# Altium footprint library con-amp.PCBLIB: 295 footprints (part 12 of 19)
Each footprint in its own frame and in the unit in brackets; x right, y up, seen from the top. Pads: shape width x height; smd on the part's side, far side on the other; paste and mask are expansions set on the pad; w line width, h text height; cw(c..) or ccw(c..) is an arc to the next point about the centre after c.
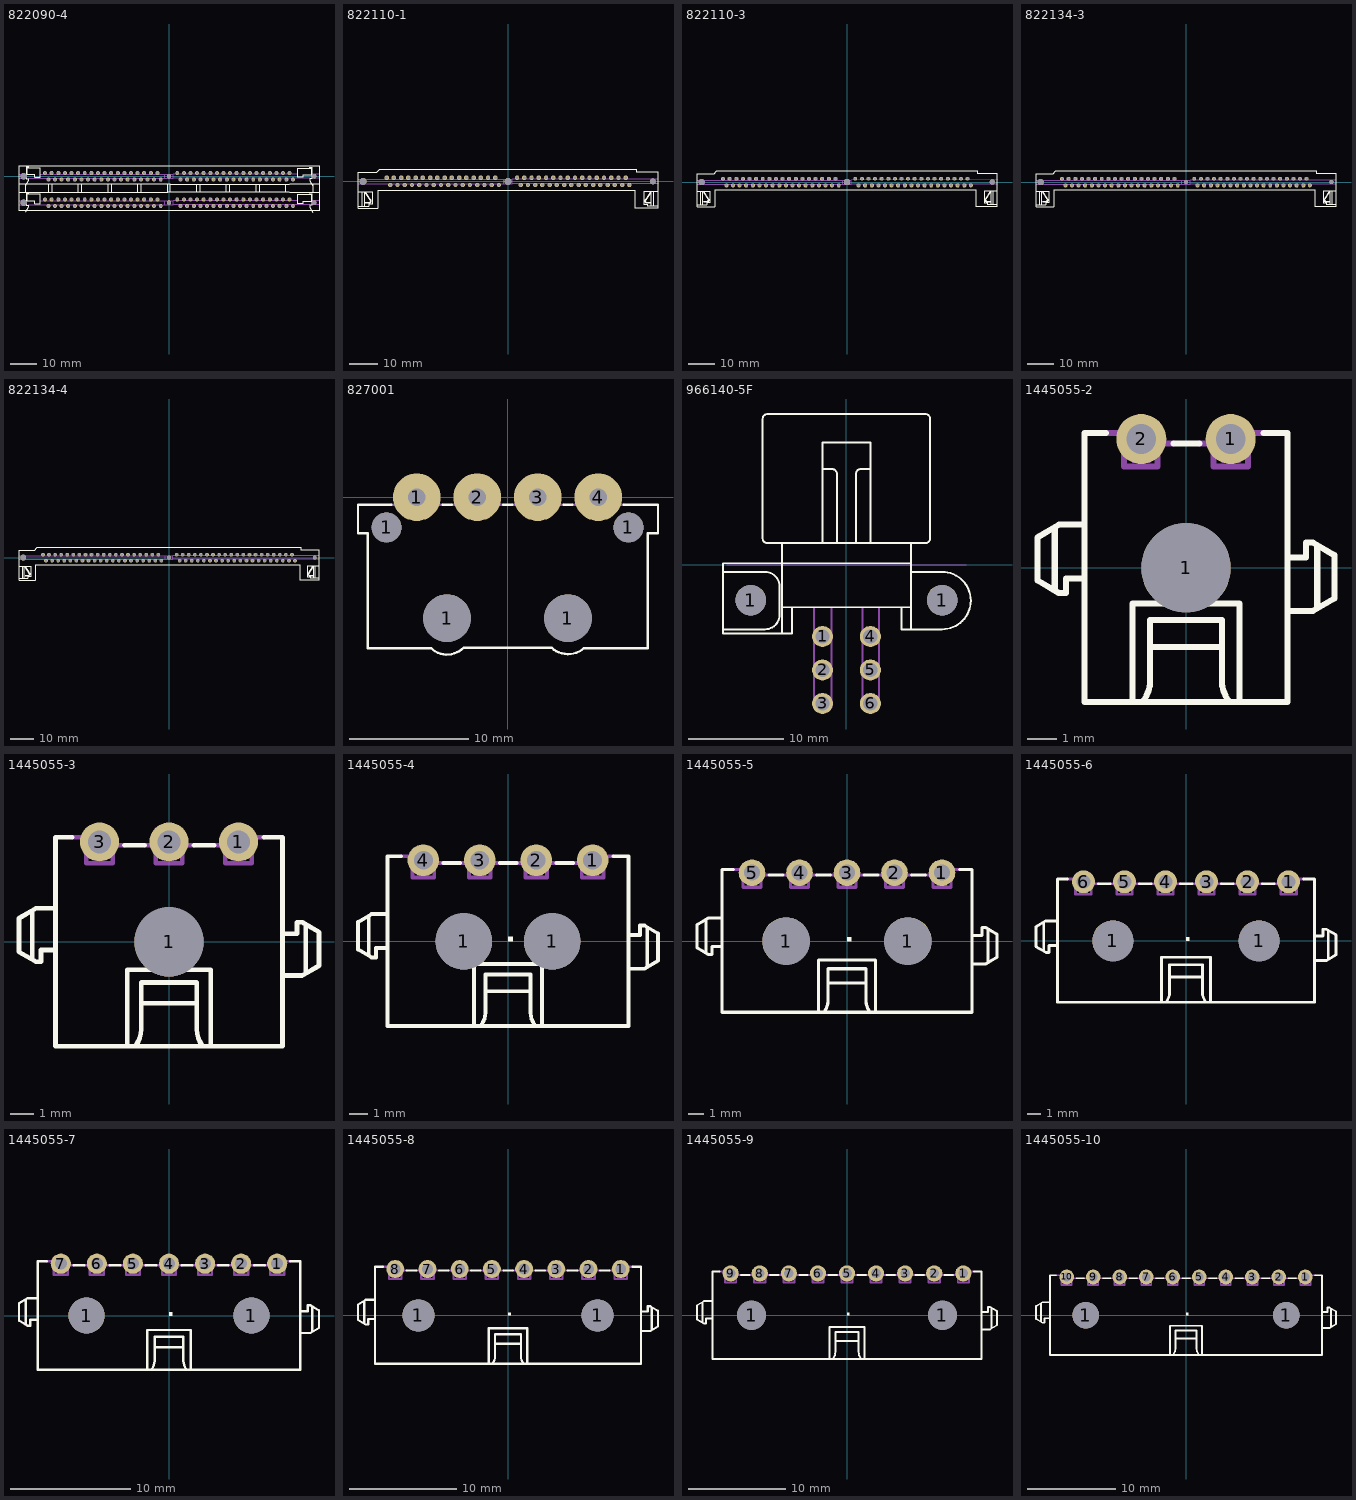
[diagram p11: the footprints below, top view; thin cyan lines are the x and y axes]

## 822090-4 [mil]
pads (150):
  round 96 hole 96: 1(-2200,-400) 1(-2200,0)
  round 64 hole 64: 1(0,-400) 1(0,0) 1(2200,-400) 1(2200,0)
  round 60 hole 40: 1-1(1875,-50) 2-1(1875,-450)
  oct 60x60 hole 40: 1-2(1825,50) 1-3(1775,-50) 1-4(1725,50) 1-5(1675,-50) 1-6(1625,50) 1-7(1575,-50) 1-8(1525,50) 1-9(1475,-50) 1-10(1425,50) 1-11(1375,-50) 1-12(1325,50) 1-13(1275,-50) 1-14(1225,50) 1-15(1175,-50) 1-16(1125,50) 1-17(1075,-50) 1-18(1025,50) 1-19(975,-50) 1-20(925,50) 1-21(875,-50) 1-22(825,50) 1-23(775,-50) 1-24(725,50) 1-25(675,-50) 1-26(625,50) 1-27(575,-50) 1-28(525,50) 1-29(475,-50) 1-30(425,50) 1-31(375,-50) 1-32(325,50) 1-33(275,-50) 1-34(225,50) 1-35(175,-50) 1-36(125,50) 1-37(-125,-50) 1-38(-175,50) 1-39(-225,-50) 1-40(-275,50) 1-41(-325,-50) 1-42(-375,50) 1-43(-425,-50) 1-44(-475,50) 1-45(-525,-50) 1-46(-575,50) 1-47(-625,-50) 1-48(-675,50) 1-49(-725,-50) 1-50(-775,50) 1-51(-825,-50) 1-52(-875,50) 1-53(-925,-50) 1-54(-975,50) 1-55(-1025,-50) 1-56(-1075,50) 1-57(-1125,-50) 1-58(-1175,50) 1-59(-1225,-50) 1-60(-1275,50) 1-61(-1325,-50) 1-62(-1375,50) 1-63(-1425,-50) 1-64(-1475,50) 1-65(-1525,-50) 1-66(-1575,50) 1-67(-1625,-50) 1-68(-1675,50) 1-69(-1725,-50) 1-70(-1775,50) 1-71(-1825,-50) 1-72(-1875,50) 2-2(1825,-350) 2-3(1775,-450) 2-4(1725,-350) 2-5(1675,-450) 2-6(1625,-350) 2-7(1575,-450) 2-8(1525,-350) 2-9(1475,-450) 2-10(1425,-350) 2-11(1375,-450) 2-12(1325,-350) 2-13(1275,-450) 2-14(1225,-350) 2-15(1175,-450) 2-16(1125,-350) 2-17(1075,-450) 2-18(1025,-350) 2-19(975,-450) 2-20(925,-350) 2-21(875,-450) 2-22(825,-350) 2-23(775,-450) 2-24(725,-350) 2-25(675,-450) 2-26(625,-350) 2-27(575,-450) 2-28(525,-350) 2-29(475,-450) 2-30(425,-350) 2-31(375,-450) 2-32(325,-350) 2-33(275,-450) 2-34(225,-350) 2-35(175,-450) 2-36(125,-350) 2-37(-125,-450) 2-38(-175,-350) 2-39(-225,-450) 2-40(-275,-350) 2-41(-325,-450) 2-42(-375,-350) 2-43(-425,-450) 2-44(-475,-350) 2-45(-525,-450) 2-46(-575,-350) 2-47(-625,-450) 2-48(-675,-350) 2-49(-725,-450) 2-50(-775,-350) 2-51(-825,-450) 2-52(-875,-350) 2-53(-925,-450) 2-54(-975,-350) 2-55(-1025,-450) 2-56(-1075,-350) 2-57(-1125,-450) 2-58(-1175,-350) 2-59(-1225,-450) 2-60(-1275,-350) 2-61(-1325,-450) 2-62(-1375,-350) 2-63(-1425,-450) 2-64(-1475,-350) 2-65(-1525,-450) 2-66(-1575,-350) 2-67(-1625,-450) 2-68(-1675,-350) 2-69(-1725,-450) 2-70(-1775,-350) 2-71(-1825,-450) 2-72(-1875,-350)
Top Overlay:
  lines w6: -2150,-375 -2150,-275 -1950,-275 -1950,-415 -2035,-415 -2035,-375 -2150,-375 ; -2150,25 -2150,125 -1950,125 -1950,-15 -2035,-15 -2035,25 -2150,25 ; 1950,-415 1950,-275 2150,-275 2150,-375 2035,-375 2035,-415 1950,-415 ; 1950,-15 1950,125 2150,125 2150,25 2035,25 2035,-15 1950,-15
  lines w10: 1820,-240 1770,-240 ; 1820,-120 1770,-120 ; 1830,-240 2180,-240 ; 1830,-120 2180,-120 ; -2270,-240 -2170,-240 ; -2270,-240 -2270,-520 2270,-520 2270,-240 ; -2270,-240 -2270,-120 ; -2270,-120 -2170,-120 ; -2270,-120 -2270,160 2270,160 2270,-120 ; -2170,-240 -1820,-240 ; -2170,-240 -2170,-120 ; -2170,-120 -1820,-120 ; -1820,-240 -1770,-240 ; -1820,-240 -1820,-120 ; -1820,-120 -1770,-120 ; -1770,-240 -1370,-240 ; -1770,-240 -1770,-120 ; -1770,-120 -1370,-120 ; -1370,-240 -1320,-240 ; -1370,-240 -1370,-120 ; -1370,-120 -1320,-120 ; -1320,-240 -920,-240 ; -1320,-240 -1320,-120 ; -1320,-120 -920,-120 ; -920,-240 -870,-240 ; -920,-240 -920,-120 ; -920,-120 -870,-120 ; -870,-240 -470,-240 ; -870,-240 -870,-120 ; -870,-120 -470,-120 ; -470,-240 -420,-240 ; -470,-240 -470,-120 ; -470,-120 -420,-120 ; -420,-240 -20,-240 ; -420,-240 -420,-120 ; -420,-120 -20,-120 ; -20,-240 -20,-120 ; -20,-240 20,-240 ; -20,-120 20,-120 ; 20,-240 420,-240 ; 20,-240 20,-120 ; 20,-120 420,-120 ; 420,-240 470,-240 ; 420,-240 420,-120 ; 420,-120 470,-120 ; 470,-240 870,-240 ; 470,-240 470,-120 ; 470,-120 870,-120 ; 870,-240 920,-240 ; 870,-240 870,-120 ; 870,-120 920,-120 ; 920,-240 1320,-240 ; 920,-240 920,-120 ; 920,-120 1320,-120 ; 1320,-240 1370,-240 ; 1320,-240 1320,-120 ; 1320,-120 1370,-120 ; 1370,-240 1770,-240 ; 1370,-240 1370,-120 ; 1370,-120 1770,-120 ; 1770,-240 1770,-120 ; 2180,-240 2270,-240 ; 2180,-240 2180,-120 ; 2180,-120 2270,-120 ; 2270,-240 2270,-120
  lines w16: -2175,-545 -2130,-465 -2130,-435 -2160,-435 -2160,-265 -2125,-265 ; -2175,-145 -2130,-65 -2130,-35 -2160,-35 -2160,135 -2125,135 ; 2125,-265 2160,-265 2160,-435 2130,-435 2130,-465 2175,-545 ; 2125,135 2160,135 2160,-35 2130,-35 2130,-65 2175,-145
Mechanical 16:
  lines w6: -2270,-430 -2170,-430 ; -2270,-370 -2170,-370 ; -2270,-30 -2165,-30 ; -2270,30 -2170,30 ; -2130,-430 -62,-430 ; -2130,-30 -62,-30 ; -1950,-370 -62,-370 ; -1945,30 -62,30 ; 1945,-370 62,-370 ; 1945,30 62,30 ; 2130,-430 62,-430 ; 2135,-30 62,-30 ; 2165,-430 2270,-430 ; 2165,-370 2270,-370 ; 2165,-30 2270,-30 ; 2165,30 2270,30 ; -62,-430 62,-430 ; -62,-430 -62,-370 ; -62,-370 62,-370 ; -62,-30 62,-30 ; -62,-30 -62,30 ; -62,30 62,30 ; 62,-430 62,-370 ; 62,-30 62,30

## 822110-1 [mil]
pads (67):
  round 95 hole 95: 1(-2000,0)
  round 96 hole 96: 1(0,0)
  round 60 hole 40: 1(1675,-50)
  round 80 hole 80: 1(2000,0)
  oct 60x60 hole 40: 2(1625,50) 3(1575,-50) 4(1525,50) 5(1475,-50) 6(1425,50) 7(1375,-50) 8(1325,50) 9(1275,-50) 10(1225,50) 11(1175,-50) 12(1125,50) 13(1075,-50) 14(1025,50) 15(975,-50) 16(925,50) 17(875,-50) 18(825,50) 19(775,-50) 20(725,50) 21(675,-50) 22(625,50) 23(575,-50) 24(525,50) 25(475,-50) 26(425,50) 27(375,-50) 28(325,50) 29(275,-50) 30(225,50) 31(175,-50) 32(125,50) 33(-125,-50) 34(-175,50) 35(-225,-50) 36(-275,50) 37(-325,-50) 38(-375,50) 39(-425,-50) 40(-475,50) 41(-525,-50) 42(-575,50) 43(-625,-50) 44(-675,50) 45(-725,-50) 46(-775,50) 47(-825,-50) 48(-875,50) 49(-925,-50) 50(-975,50) 51(-1025,-50) 52(-1075,50) 53(-1125,-50) 54(-1175,50) 55(-1225,-50) 56(-1275,50) 57(-1325,-50) 58(-1375,50) 59(-1425,-50) 60(-1475,50) 61(-1525,-50) 62(-1575,50) 63(-1625,-50) 64(-1675,50)
Top Overlay:
  lines w10: -2070,-340 -2070,-370 -1800,-370 -1800,-120 1750,-120 1750,-370 2070,-370 2070,-340 ; -2070,-340 -2070,-140 ; -2070,-340 -2010,-340 ; -2070,-140 -2070,125 -1810,125 -1775,160 1775,160 1775,125 2070,125 2070,-140 ; -2070,-140 -2010,-140 ; -2010,-340 -1980,-340 ; -2010,-340 -2010,-140 ; -2010,-140 -1980,-140 ; -1980,-340 -1925,-340 -1925,-315 -1875,-315 -1875,-140 -1980,-140 ; -1980,-340 -1980,-140 ; 1980,-340 2010,-340 ; 1980,-340 1925,-340 1925,-315 1875,-315 1875,-140 1980,-140 ; 1980,-340 1980,-140 ; 1980,-140 2010,-140 ; 2010,-340 2070,-340 ; 2010,-340 2010,-140 ; 2010,-140 2070,-140 ; 2070,-340 2070,-140
  lines w24: -1970,-295 -1920,-295 ccw(c-1917.5,-271.25) -1900,-255 -1970,-150 ; 1970,-295 1920,-295 cw(c1917.5,-271.25) 1900,-255 1970,-150
Mechanical 16:
  lines w6: -2065,-30 -62,-30 ; -2065,30 -62,30 ; 2065,30 62,30 ; 2070,-30 62,-30 ; -62,-30 62,-30 ; -62,-30 -62,30 ; -62,30 62,30 ; 62,-30 62,30

## 822110-3 [mil]
pads (75):
  round 95 hole 95: 1(-2200,0)
  round 96 hole 96: 1(0,0)
  round 60 hole 40: 1(1875,-50)
  round 80 hole 80: 1(2200,0)
  oct 60x60 hole 40: 2(1825,50) 3(1775,-50) 4(1725,50) 5(1675,-50) 6(1625,50) 7(1575,-50) 8(1525,50) 9(1475,-50) 10(1425,50) 11(1375,-50) 12(1325,50) 13(1275,-50) 14(1225,50) 15(1175,-50) 16(1125,50) 17(1075,-50) 18(1025,50) 19(975,-50) 20(925,50) 21(875,-50) 22(825,50) 23(775,-50) 24(725,50) 25(675,-50) 26(625,50) 27(575,-50) 28(525,50) 29(475,-50) 30(425,50) 31(375,-50) 32(325,50) 33(275,-50) 34(225,50) 35(175,-50) 36(125,50) 37(-125,-50) 38(-175,50) 39(-225,-50) 40(-275,50) 41(-325,-50) 42(-375,50) 43(-425,-50) 44(-475,50) 45(-525,-50) 46(-575,50) 47(-625,-50) 48(-675,50) 49(-725,-50) 50(-775,50) 51(-825,-50) 52(-875,50) 53(-925,-50) 54(-975,50) 55(-1025,-50) 56(-1075,50) 57(-1125,-50) 58(-1175,50) 59(-1225,-50) 60(-1275,50) 61(-1325,-50) 62(-1375,50) 63(-1425,-50) 64(-1475,50) 65(-1525,-50) 66(-1575,50) 67(-1625,-50) 68(-1675,50) 69(-1725,-50) 70(-1775,50) 71(-1825,-50) 72(-1875,50)
Top Overlay:
  lines w10: -2270,-340 -2270,-370 -2000,-370 -2000,-120 1950,-120 1950,-370 2270,-370 2270,-340 ; -2270,-340 -2270,-140 ; -2270,-340 -2210,-340 ; -2270,-140 -2270,125 -2010,125 -1975,160 1975,160 1975,125 2270,125 2270,-140 ; -2270,-140 -2210,-140 ; -2210,-340 -2180,-340 ; -2210,-340 -2210,-140 ; -2210,-140 -2180,-140 ; -2180,-340 -2125,-340 -2125,-315 -2075,-315 -2075,-140 -2180,-140 ; -2180,-340 -2180,-140 ; 2180,-340 2210,-340 ; 2180,-340 2125,-340 2125,-315 2075,-315 2075,-140 2180,-140 ; 2180,-340 2180,-140 ; 2180,-140 2210,-140 ; 2210,-340 2270,-340 ; 2210,-340 2210,-140 ; 2210,-140 2270,-140 ; 2270,-340 2270,-140
  lines w24: -2170,-295 -2120,-295 ccw(c-2117.5,-271.25) -2100,-255 -2170,-150 ; 2170,-295 2120,-295 cw(c2117.5,-271.25) 2100,-255 2170,-150
Mechanical 16:
  lines w6: -2265,-30 -62,-30 ; -2265,30 -62,30 ; 2270,-30 62,-30 ; 2270,35 62,30 ; -62,-30 62,-30 ; -62,-30 -62,30 ; -62,30 62,30 ; 62,-30 62,30

## 822134-3 [mil]
pads (75):
  round 95 hole 95: 1(-2200,0)
  round 64 hole 64: 1(0,0) 1(2200,0)
  round 60 hole 40: 1(1875,-50)
  oct 60x60 hole 40: 2(1825,50) 3(1775,-50) 4(1725,50) 5(1675,-50) 6(1625,50) 7(1575,-50) 8(1525,50) 9(1475,-50) 10(1425,50) 11(1375,-50) 12(1325,50) 13(1275,-50) 14(1225,50) 15(1175,-50) 16(1125,50) 17(1075,-50) 18(1025,50) 19(975,-50) 20(925,50) 21(875,-50) 22(825,50) 23(775,-50) 24(725,50) 25(675,-50) 26(625,50) 27(575,-50) 28(525,50) 29(475,-50) 30(425,50) 31(375,-50) 32(325,50) 33(275,-50) 34(225,50) 35(175,-50) 36(125,50) 37(-125,-50) 38(-175,50) 39(-225,-50) 40(-275,50) 41(-325,-50) 42(-375,50) 43(-425,-50) 44(-475,50) 45(-525,-50) 46(-575,50) 47(-625,-50) 48(-675,50) 49(-725,-50) 50(-775,50) 51(-825,-50) 52(-875,50) 53(-925,-50) 54(-975,50) 55(-1025,-50) 56(-1075,50) 57(-1125,-50) 58(-1175,50) 59(-1225,-50) 60(-1275,50) 61(-1325,-50) 62(-1375,50) 63(-1425,-50) 64(-1475,50) 65(-1525,-50) 66(-1575,50) 67(-1625,-50) 68(-1675,50) 69(-1725,-50) 70(-1775,50) 71(-1825,-50) 72(-1875,50)
Top Overlay:
  lines w10: -2270,-340 -2270,-370 -2000,-370 -2000,-120 1950,-120 1950,-370 2270,-370 2270,-340 ; -2270,-340 -2270,-140 ; -2270,-340 -2210,-340 ; -2270,-140 -2270,125 -2010,125 -1975,160 1975,160 1975,125 2270,125 2270,-140 ; -2270,-140 -2210,-140 ; -2210,-340 -2180,-340 ; -2210,-340 -2210,-140 ; -2210,-140 -2180,-140 ; -2180,-340 -2125,-340 -2125,-315 -2075,-315 -2075,-140 -2180,-140 ; -2180,-340 -2180,-140 ; 2180,-340 2210,-340 ; 2180,-340 2125,-340 2125,-315 2075,-315 2075,-140 2180,-140 ; 2180,-340 2180,-140 ; 2180,-140 2210,-140 ; 2210,-340 2270,-340 ; 2210,-340 2210,-140 ; 2210,-140 2270,-140 ; 2270,-340 2270,-140
  lines w24: -2170,-295 -2120,-295 ccw(c-2117.5,-271.25) -2100,-255 -2170,-150 ; 2170,-295 2120,-295 cw(c2117.5,-271.25) 2100,-255 2170,-150
Mechanical 16:
  lines w6: -2265,-30 -62,-30 ; -2265,30 -62,30 ; 2265,-30 62,-30 ; 2265,30 62,30 ; -62,-30 62,-30 ; -62,-30 -62,30 ; -62,30 62,30 ; 62,-30 62,30

## 822134-4 [mil]
pads (83):
  round 95 hole 95: 1(-2400,0)
  round 64 hole 64: 1(0,0) 1(2400,0)
  round 60 hole 40: 1(2075,-50)
  oct 60x60 hole 40: 2(2025,50) 3(1975,-50) 4(1925,50) 5(1875,-50) 6(1825,50) 7(1775,-50) 8(1725,50) 9(1675,-50) 10(1625,50) 11(1575,-50) 12(1525,50) 13(1475,-50) 14(1425,50) 15(1375,-50) 16(1325,50) 17(1275,-50) 18(1225,50) 19(1175,-50) 20(1125,50) 21(1075,-50) 22(1025,50) 23(975,-50) 24(925,50) 25(875,-50) 26(825,50) 27(775,-50) 28(725,50) 29(675,-50) 30(625,50) 31(575,-50) 32(525,50) 33(475,-50) 34(425,50) 35(375,-50) 36(325,50) 37(275,-50) 38(225,50) 39(175,-50) 40(125,50) 41(-125,-50) 42(-175,50) 43(-225,-50) 44(-275,50) 45(-325,-50) 46(-375,50) 47(-425,-50) 48(-475,50) 49(-525,-50) 50(-575,50) 51(-625,-50) 52(-675,50) 53(-725,-50) 54(-775,50) 55(-825,-50) 56(-875,50) 57(-925,-50) 58(-975,50) 59(-1025,-50) 60(-1075,50) 61(-1125,-50) 62(-1175,50) 63(-1225,-50) 64(-1275,50) 65(-1325,-50) 66(-1375,50) 67(-1425,-50) 68(-1475,50) 69(-1525,-50) 70(-1575,50) 71(-1625,-50) 72(-1675,50) 73(-1725,-50) 74(-1775,50) 75(-1825,-50) 76(-1875,50) 77(-1925,-50) 78(-1975,50) 79(-2025,-50) 80(-2075,50)
Top Overlay:
  lines w10: -2470,-340 -2470,-370 -2200,-370 -2200,-120 2150,-120 2150,-370 2470,-370 2470,-340 ; -2470,-340 -2470,-140 ; -2470,-340 -2410,-340 ; -2470,-140 -2470,125 -2210,125 -2175,160 2175,160 2175,125 2470,125 2470,-140 ; -2470,-140 -2410,-140 ; -2410,-340 -2380,-340 ; -2410,-340 -2410,-140 ; -2410,-140 -2380,-140 ; -2380,-340 -2325,-340 -2325,-315 -2275,-315 -2275,-140 -2380,-140 ; -2380,-340 -2380,-140 ; 2380,-340 2410,-340 ; 2380,-340 2325,-340 2325,-315 2275,-315 2275,-140 2380,-140 ; 2380,-340 2380,-140 ; 2380,-140 2410,-140 ; 2410,-340 2470,-340 ; 2410,-340 2410,-140 ; 2410,-140 2470,-140 ; 2470,-340 2470,-140
  lines w24: -2370,-295 -2320,-295 ccw(c-2317.5,-271.25) -2300,-255 -2370,-150 ; 2370,-295 2320,-295 cw(c2317.5,-271.25) 2300,-255 2370,-150
Mechanical 16:
  lines w6: -2465,-30 -62,-30 ; -2465,30 -62,30 ; 2465,-30 62,-30 ; 2465,30 62,30 ; -62,-30 62,-30 ; -62,-30 -62,30 ; -62,30 62,30 ; 62,-30 62,30

## 827001 [mm]
pads (8):
  round 2.5 hole 2.5: 1(-10.16,-2.54) 1(10.16,-2.54)
  round 4 hole 1.5: 1(-7.62,0) 2(-2.54,0) 3(2.54,0) 4(7.62,0)
  round 4 hole 4: 1(-5.08,-10.16) 1(5.08,-10.16)
Top Overlay:
  circle w0.203: c3.688,-12.638 r0
  lines w0.203: -9.779,-0.635 -12.555,-0.635 -12.555,-3.025 -11.726,-3.025 -11.726,-12.679 -6.423,-12.679 ccw(c-5.077,-11.252) -3.688,-12.638 3.688,-12.638 ; -5.461,-0.635 -4.699,-0.635 ; -0.381,-0.635 0.381,-0.635 ; 4.699,-0.635 5.461,-0.635 ; 9.779,-0.635 12.638,-0.635 12.638,-3.025 11.768,-3.025 11.768,-12.679 6.423,-12.679 cw(c5.079,-11.113) 3.688,-12.638 ; 3.688,-12.638 3.688,-12.638
Mechanical 16:
  lines w0.203: -9.779,-0.635 -9.398,-0.635 -9.398,0 -8.636,0.508 -8.255,0.508 -8.128,0.127 -7.112,0.127 -6.985,0.508 -6.604,0.508 -5.842,0.127 -5.842,-0.635 -5.461,-0.635 ; -4.699,-0.635 -4.318,-0.635 -4.318,0 -3.556,0.508 -3.175,0.508 -3.048,0.127 -2.032,0.127 -1.905,0.508 -1.524,0.508 -0.762,0.127 -0.762,-0.635 -0.381,-0.635 ; 0.381,-0.635 0.762,-0.635 0.762,0 1.524,0.508 1.905,0.508 2.032,0.127 3.048,0.127 3.175,0.508 3.556,0.508 4.318,0.127 4.318,-0.635 4.699,-0.635 ; 5.461,-0.635 5.842,-0.635 5.842,0 6.604,0.508 6.985,0.508 7.112,0.127 8.128,0.127 8.255,0.508 8.636,0.508 9.398,0.127 9.398,-0.635 9.779,-0.635

## 966140-5F [mm]
pads (8):
  round 3.2 hole 3.2: 1(-10,-3.7) 1(10,-3.7)
  round 2.2 hole 1.5: 1(-2.5,-7.5) 2(-2.5,-11) 3(-2.5,-14.5) 4(2.5,-7.5) 5(2.5,-11) 6(2.5,-14.5)
Top Overlay:
  lines w0.203: -12.75,-6.75 -8.5,-6.75 ccw(c-8.5,-5.25) -7,-5.25 -7,-2.25 ccw(c-8.5,-2.25) -8.5,-0.75 -12.75,-0.75 ; -6.727,-7.15 -6.727,2.222 ; -6.612,-4.448 6.612,-4.448 ; -5.692,-4.563 -5.692,-7.208 -12.88,-7.208 -12.88,0.152 -12.822,0.152 6.612,0.152 ; 5.75,-4.5 5.75,-6.75 6.75,-6.75 ; -2.5,2.25 -1,2.25 ; -2.5,2.25 -8.25,2.25 cw(c-8.25,2.75) -8.75,2.75 -8.75,15.25 cw(c-8.25,15.25) -8.25,15.75 8.25,15.75 cw(c8.25,15.25) 8.75,15.25 8.75,2.75 cw(c8.25,2.75) 8.25,2.25 6.75,2.25 ; -2.5,2.25 -2.5,10 ; -2.5,10 -2.5,12.75 2.5,12.75 2.5,10 ; -2.5,10 -1.5,10 cw(c-1.5,9.5) -1,9.5 -1,2.25 ; -1,2.25 1,2.25 ; 1,2.25 2.5,2.25 ; 1,2.25 1,9.5 cw(c1.5,9.5) 1.5,10 2.5,10 ; 2.5,2.25 6.75,2.25 ; 2.5,2.25 2.5,10 ; 6.75,-6.75 6.75,-0.75 ; 6.75,-6.75 10,-6.75 ccw(c10,-3.75) 13,-3.75 ccw(c10,-3.75) 10,-0.75 6.75,-0.75 ; 6.75,-0.75 6.75,2.25
Mechanical 1:
  lines w0: -12.5,0 12.5,0
Mechanical 16:
  lines w0.203: -3.392,-4.505 -3.392,-14.913 -1.552,-14.913 -1.552,-4.563 ; 1.668,-4.563 1.668,-14.913 3.392,-14.913 3.392,-4.563

## 1445055-2 [mm]
pads (3):
  round 3 hole 3: 1(0,0)
  round 1.676 hole 1: 1(1.5,4.32) 2(-1.5,4.32)
Top Overlay:
  region: 0,0 0.254,0 0.254,0.254 0,0.254
  region: 0,0 0.254,0 0.254,0.254 0,0.254
  region: 0,0 0.254,0 0.254,0.254 0,0.254
  region: 0,0 0.254,0 0.254,0.254 0,0.254
  lines w0.203: -4.4,-0.7 -4.4,1.3 ; -3.5,-0.35 -4.025,-0.35 -4.025,-0.85 -4.25,-0.85 -4.975,-0.425 -4.975,1.025 -4.25,1.45 -3.5,1.45 ; -2.675,4.525 -3.4,4.525 -3.4,-4.5 3.4,-4.5 3.4,4.525 2.6,4.525 ; -1.8,-4.4 -1.8,-1.2 1.8,-1.2 1.8,-4.4 ; -1.425,-4.45 ccw(c-2.325,-3.775) -1.2,-3.775 -1.2,-2.65 ; -0.425,4.175 0.45,4.175 ; 1.425,-4.45 cw(c2.325,-3.775) 1.2,-3.775 1.2,-2.65 ; 3.5,-1.45 4.25,-1.45 4.975,-1.025 4.975,0.425 4.25,0.85 4.025,0.85 4.025,0.35 3.5,0.35 ; 4.4,-1.3 4.4,0.7 ; -1.2,-2.65 1.2,-2.65 ; -1.2,-2.65 -1.2,-1.75 1.2,-1.75 1.2,-2.65
Mechanical 16:
  rectangle: -1.813,3.513 -1.187,5
  rectangle: 1.187,3.513 1.825,5
  lines w0.203: -2.675,4.525 -2.075,4.525 -2.075,3.4 -0.95,3.4 -0.95,4.175 -0.425,4.175 ; 0.45,4.175 0.925,4.175 0.925,3.4 2.075,3.4 2.075,4.525 2.6,4.525

## 1445055-3 [mm]
pads (4):
  round 3 hole 3: 1(0,0)
  round 1.676 hole 1: 1(3,4.32) 2(0,4.32) 3(-3,4.32)
Top Overlay:
  region: 0,0 0.254,0 0.254,0.254 0,0.254
  region: 0,0 0.254,0 0.254,0.254 0,0.254
  region: 0,0 0.254,0 0.254,0.254 0,0.254
  region: 0,0 0.254,0 0.254,0.254 0,0.254
  lines w0.203: -5.9,-0.7 -5.9,1.3 ; -5,-0.35 -5.525,-0.35 -5.525,-0.85 -5.75,-0.85 -6.475,-0.425 -6.475,1.025 -5.75,1.45 -5,1.45 ; -4.175,4.525 -4.9,4.525 -4.9,-4.5 4.9,-4.5 4.9,4.525 4.1,4.525 ; -1.925,4.175 -1.05,4.175 ; -1.8,-4.4 -1.8,-1.2 1.8,-1.2 1.8,-4.4 ; -1.425,-4.45 ccw(c-2.325,-3.775) -1.2,-3.775 -1.2,-2.65 ; 1.075,4.175 1.95,4.175 ; 1.425,-4.45 cw(c2.325,-3.775) 1.2,-3.775 1.2,-2.65 ; 5,-1.45 5.75,-1.45 6.475,-1.025 6.475,0.425 5.75,0.85 5.525,0.85 5.525,0.35 5,0.35 ; 5.9,-1.3 5.9,0.7 ; -1.2,-2.65 1.2,-2.65 ; -1.2,-2.65 -1.2,-1.75 1.2,-1.75 1.2,-2.65
Mechanical 16:
  rectangle: 2.688,3.513 3.325,5
  rectangle: -0.312,3.513 0.325,5
  rectangle: -3.312,3.513 -2.688,5
  lines w0.203: -4.175,4.525 -3.575,4.525 -3.575,3.4 -2.425,3.4 -2.425,4.175 -1.925,4.175 ; -1.05,4.175 -0.575,4.175 -0.575,3.4 0.575,3.4 0.575,4.175 1.075,4.175 ; 1.95,4.175 2.425,4.175 2.425,3.4 3.575,3.4 3.575,4.525 4.1,4.525

## 1445055-4 [mm]
pads (6):
  round 3 hole 3: 1(-2.35,0) 1(2.35,0)
  round 1.676 hole 1: 1(4.5,4.32) 2(1.5,4.32) 3(-1.5,4.32) 4(-4.5,4.32)
Top Overlay:
  region: 0,0 0.254,0 0.254,0.254 0,0.254
  region: 0,0 0.254,0 0.254,0.254 0,0.254
  region: 0,0 0.254,0 0.254,0.254 0,0.254
  region: 0,0 0.254,0 0.254,0.254 0,0.254
  lines w0.203: -7.4,-0.7 -7.4,1.3 ; -6.5,-0.35 -7.025,-0.35 -7.025,-0.85 -7.25,-0.85 -7.975,-0.425 -7.975,1.025 -7.25,1.45 -6.5,1.45 ; -5.675,4.525 -6.4,4.525 -6.4,-4.5 6.4,-4.5 6.4,4.525 5.6,4.525 ; -3.425,4.175 -2.55,4.175 ; -1.8,-4.4 -1.8,-1.2 1.8,-1.2 1.8,-4.4 ; -1.425,-4.45 ccw(c-2.325,-3.775) -1.2,-3.775 -1.2,-2.65 ; -0.425,4.175 0.45,4.175 ; 1.425,-4.45 cw(c2.325,-3.775) 1.2,-3.775 1.2,-2.65 ; 2.575,4.175 3.45,4.175 ; 6.5,-1.45 7.25,-1.45 7.975,-1.025 7.975,0.425 7.25,0.85 7.025,0.85 7.025,0.35 6.5,0.35 ; 7.4,-1.3 7.4,0.7 ; -1.2,-2.65 1.2,-2.65 ; -1.2,-2.65 -1.2,-1.75 1.2,-1.75 1.2,-2.65
Mechanical 16:
  rectangle: 4.187,3.513 4.825,5
  rectangle: -1.813,3.513 -1.175,5
  rectangle: 1.187,3.513 1.825,5
  rectangle: -4.813,3.513 -4.187,5
  lines w0.203: -5.675,4.525 -5.075,4.525 -5.075,3.4 -3.925,3.4 -3.925,4.175 -3.425,4.175 ; -2.55,4.175 -2.075,4.175 -2.075,3.4 -0.925,3.4 -0.925,4.175 -0.425,4.175 ; 0.45,4.175 0.925,4.175 0.925,3.4 2.075,3.4 2.075,4.175 2.575,4.175 ; 3.45,4.175 3.925,4.175 3.925,3.4 5.075,3.4 5.075,4.525 5.6,4.525

## 1445055-5 [mm]
pads (7):
  round 3 hole 3: 1(-3.85,0) 1(3.85,0)
  round 1.676 hole 1: 1(6,4.32) 2(3,4.32) 3(0,4.32) 4(-3,4.32) 5(-6,4.32)
Top Overlay:
  region: 0,0 0.254,0 0.254,0.254 0,0.254
  region: 0,0 0.254,0 0.254,0.254 0,0.254
  region: 0,0 0.254,0 0.254,0.254 0,0.254
  region: 0,0 0.254,0 0.254,0.254 0,0.254
  lines w0.203: -8.9,-0.7 -8.9,1.3 ; -8,-0.35 -8.525,-0.35 -8.525,-0.85 -8.75,-0.85 -9.475,-0.425 -9.475,1.025 -8.75,1.45 -8,1.45 ; -7.175,4.525 -7.9,4.525 -7.9,-4.5 7.9,-4.5 7.9,4.525 7.1,4.525 ; -4.925,4.175 -4.05,4.175 ; -1.925,4.175 -1.05,4.175 ; -1.8,-4.4 -1.8,-1.2 1.8,-1.2 1.8,-4.4 ; -1.425,-4.45 ccw(c-2.325,-3.775) -1.2,-3.775 -1.2,-2.65 ; 1.075,4.175 1.95,4.175 ; 1.425,-4.45 cw(c2.325,-3.775) 1.2,-3.775 1.2,-2.65 ; 4.075,4.175 4.95,4.175 ; 8,-1.45 8.75,-1.45 9.475,-1.025 9.475,0.425 8.75,0.85 8.525,0.85 8.525,0.35 8,0.35 ; 8.9,-1.3 8.9,0.7 ; -1.2,-2.65 1.2,-2.65 ; -1.2,-2.65 -1.2,-1.75 1.2,-1.75 1.2,-2.65
Mechanical 16:
  rectangle: 5.688,3.513 6.325,5
  rectangle: -0.312,3.513 0.325,5
  rectangle: 2.688,3.513 3.325,5
  rectangle: -3.312,3.513 -2.675,5
  rectangle: -6.312,3.513 -5.688,5
  lines w0.203: -7.175,4.525 -6.575,4.525 -6.575,3.4 -5.425,3.4 -5.425,4.175 -4.925,4.175 ; -4.05,4.175 -3.575,4.175 -3.575,3.4 -2.425,3.4 -2.425,4.175 -1.925,4.175 ; -1.05,4.175 -0.575,4.175 -0.575,3.4 0.575,3.4 0.575,4.175 1.075,4.175 ; 1.95,4.175 2.425,4.175 2.425,3.4 3.575,3.4 3.575,4.175 4.075,4.175 ; 4.95,4.175 5.425,4.175 5.425,3.4 6.575,3.4 6.575,4.525 7.1,4.525

## 1445055-6 [mm]
pads (8):
  round 3 hole 3: 1(-5.35,0) 1(5.35,0)
  round 1.676 hole 1: 1(7.5,4.32) 2(4.5,4.32) 3(1.5,4.32) 4(-1.5,4.32) 5(-4.5,4.32) 6(-7.5,4.32)
Top Overlay:
  region: 0,0 0.254,0 0.254,0.254 0,0.254
  region: 0,0 0.254,0 0.254,0.254 0,0.254
  region: 0,0 0.254,0 0.254,0.254 0,0.254
  region: 0,0 0.254,0 0.254,0.254 0,0.254
  lines w0.203: -10.4,-0.7 -10.4,1.3 ; -9.5,-0.35 -10.025,-0.35 -10.025,-0.85 -10.25,-0.85 -10.975,-0.425 -10.975,1.025 -10.25,1.45 -9.5,1.45 ; -8.675,4.525 -9.4,4.525 -9.4,-4.5 9.4,-4.5 9.4,4.525 8.6,4.525 ; -6.425,4.175 -5.55,4.175 ; -3.425,4.175 -2.55,4.175 ; -1.8,-4.4 -1.8,-1.2 1.8,-1.2 1.8,-4.4 ; -1.425,-4.45 ccw(c-2.325,-3.775) -1.2,-3.775 -1.2,-2.65 ; -0.425,4.175 0.45,4.175 ; 1.425,-4.45 cw(c2.325,-3.775) 1.2,-3.775 1.2,-2.65 ; 2.575,4.175 3.45,4.175 ; 5.575,4.175 6.45,4.175 ; 9.5,-1.45 10.25,-1.45 10.975,-1.025 10.975,0.425 10.25,0.85 10.025,0.85 10.025,0.35 9.5,0.35 ; 10.4,-1.3 10.4,0.7 ; -1.2,-2.65 1.2,-2.65 ; -1.2,-2.65 -1.2,-1.75 1.2,-1.75 1.2,-2.65
Mechanical 16:
  rectangle: 7.187,3.513 7.825,5
  rectangle: 1.187,3.513 1.825,5
  rectangle: 4.187,3.513 4.825,5
  rectangle: -1.813,3.513 -1.175,5
  rectangle: -4.813,3.513 -4.175,5
  rectangle: -7.813,3.513 -7.187,5
  lines w0.203: -8.675,4.525 -8.075,4.525 -8.075,3.4 -6.925,3.4 -6.925,4.175 -6.425,4.175 ; -5.55,4.175 -5.075,4.175 -5.075,3.4 -3.925,3.4 -3.925,4.175 -3.425,4.175 ; -2.55,4.175 -2.075,4.175 -2.075,3.4 -0.925,3.4 -0.925,4.175 -0.425,4.175 ; 0.45,4.175 0.925,4.175 0.925,3.4 2.075,3.4 2.075,4.175 2.575,4.175 ; 3.45,4.175 3.925,4.175 3.925,3.4 5.075,3.4 5.075,4.175 5.575,4.175 ; 6.45,4.175 6.925,4.175 6.925,3.4 8.075,3.4 8.075,4.525 8.6,4.525

## 1445055-7 [mm]
pads (9):
  round 3 hole 3: 1(-6.85,0) 1(6.85,0)
  round 1.676 hole 1: 1(9,4.32) 2(6,4.32) 3(3,4.32) 4(0,4.32) 5(-3,4.32) 6(-6,4.32) 7(-9,4.32)
Top Overlay:
  region: 0,0 0.254,0 0.254,0.254 0,0.254
  region: 0,0 0.254,0 0.254,0.254 0,0.254
  region: 0,0 0.254,0 0.254,0.254 0,0.254
  region: 0,0 0.254,0 0.254,0.254 0,0.254
  lines w0.203: -11.9,-0.7 -11.9,1.3 ; -11,-0.35 -11.525,-0.35 -11.525,-0.85 -11.75,-0.85 -12.475,-0.425 -12.475,1.025 -11.75,1.45 -11,1.45 ; -10.175,4.525 -10.9,4.525 -10.9,-4.5 10.9,-4.5 10.9,4.525 10.1,4.525 ; -7.925,4.175 -7.05,4.175 ; -4.925,4.175 -4.05,4.175 ; -1.925,4.175 -1.05,4.175 ; -1.8,-4.4 -1.8,-1.2 1.8,-1.2 1.8,-4.4 ; -1.425,-4.45 ccw(c-2.325,-3.775) -1.2,-3.775 -1.2,-2.65 ; 1.075,4.175 1.95,4.175 ; 1.425,-4.45 cw(c2.325,-3.775) 1.2,-3.775 1.2,-2.65 ; 4.075,4.175 4.95,4.175 ; 7.075,4.175 7.95,4.175 ; 11,-1.45 11.75,-1.45 12.475,-1.025 12.475,0.425 11.75,0.85 11.525,0.85 11.525,0.35 11,0.35 ; 11.9,-1.3 11.9,0.7 ; -1.2,-2.65 1.2,-2.65 ; -1.2,-2.65 -1.2,-1.75 1.2,-1.75 1.2,-2.65
Mechanical 16:
  rectangle: 8.688,3.513 9.325,5
  rectangle: 2.688,3.513 3.325,5
  rectangle: 5.688,3.513 6.325,5
  rectangle: -0.312,3.513 0.325,5
  rectangle: -3.312,3.513 -2.675,5
  rectangle: -6.312,3.513 -5.675,5
  rectangle: -9.312,3.513 -8.688,5
  lines w0.203: -10.175,4.525 -9.575,4.525 -9.575,3.4 -8.425,3.4 -8.425,4.175 -7.925,4.175 ; -7.05,4.175 -6.575,4.175 -6.575,3.4 -5.425,3.4 -5.425,4.175 -4.925,4.175 ; -4.05,4.175 -3.575,4.175 -3.575,3.4 -2.425,3.4 -2.425,4.175 -1.925,4.175 ; -1.05,4.175 -0.575,4.175 -0.575,3.4 0.575,3.4 0.575,4.175 1.075,4.175 ; 1.95,4.175 2.425,4.175 2.425,3.4 3.575,3.4 3.575,4.175 4.075,4.175 ; 4.95,4.175 5.425,4.175 5.425,3.4 6.575,3.4 6.575,4.175 7.075,4.175 ; 7.95,4.175 8.425,4.175 8.425,3.4 9.575,3.4 9.575,4.525 10.1,4.525

## 1445055-8 [mil]
pads (10):
  round 118.11 hole 118.11: 1(-328.74,0) 1(328.74,0)
  round 66 hole 39.37: 1(413.39,170.08) 2(295.28,170.08) 3(177.17,170.08) 4(59.06,170.08) 5(-59.06,170.08) 6(-177.17,170.08) 7(-295.28,170.08) 8(-413.39,170.08)
Top Overlay:
  region: 0,0 10,0 10,10 0,10
  region: 0,0 10,0 10,10 0,10
  region: 0,0 10,0 10,10 0,10
  region: 0,0 10,0 10,10 0,10
  lines w8: -527.56,-27.56 -527.56,51.18 ; -492.13,-13.78 -512.8,-13.78 -512.8,-33.46 -521.65,-33.46 -550.2,-16.73 -550.2,40.35 -521.65,57.09 -492.13,57.09 ; -459.65,178.15 -488.19,178.15 -488.19,-177.17 488.19,-177.17 488.19,178.15 456.69,178.15 ; -371.06,164.37 -336.61,164.37 ; -252.95,164.37 -218.5,164.37 ; -134.84,164.37 -100.39,164.37 ; -70.87,-173.23 -70.87,-47.24 70.87,-47.24 70.87,-173.23 ; -56.1,-175.2 ccw(c-91.54,-148.62) -47.24,-148.62 -47.24,-104.33 ; -16.73,164.37 17.72,164.37 ; 56.1,-175.2 cw(c91.54,-148.62) 47.24,-148.62 47.24,-104.33 ; 101.38,164.37 135.83,164.37 ; 219.49,164.37 253.94,164.37 ; 337.6,164.37 372.05,164.37 ; 492.13,-57.09 521.65,-57.09 550.2,-40.35 550.2,16.73 521.65,33.46 512.8,33.46 512.8,13.78 492.13,13.78 ; 527.56,-51.18 527.56,27.56 ; -47.24,-104.33 47.24,-104.33 ; -47.24,-104.33 -47.24,-68.9 47.24,-68.9 47.24,-104.33
Mechanical 16:
  rectangle: 401.08,138.29 426.18,196.85
  rectangle: 164.86,138.29 189.96,196.85
  rectangle: 282.97,138.29 308.07,196.85
  rectangle: 46.75,138.29 71.85,196.85
  rectangle: -71.36,138.29 -46.26,196.85
  rectangle: -189.47,138.29 -164.37,196.85
  rectangle: -307.58,138.29 -282.48,196.85
  rectangle: -425.69,138.29 -401.08,196.85
  lines w8: -459.65,178.15 -436.02,178.15 -436.02,133.86 -390.75,133.86 -390.75,164.37 -371.06,164.37 ; -336.61,164.37 -317.91,164.37 -317.91,133.86 -272.64,133.86 -272.64,164.37 -252.95,164.37 ; -218.5,164.37 -199.8,164.37 -199.8,133.86 -154.53,133.86 -154.53,164.37 -134.84,164.37 ; -100.39,164.37 -81.69,164.37 -81.69,133.86 -36.42,133.86 -36.42,164.37 -16.73,164.37 ; 17.72,164.37 36.42,164.37 36.42,133.86 81.69,133.86 81.69,164.37 101.38,164.37 ; 135.83,164.37 154.53,164.37 154.53,133.86 199.8,133.86 199.8,164.37 219.49,164.37 ; 253.94,164.37 272.64,164.37 272.64,133.86 317.91,133.86 317.91,164.37 337.6,164.37 ; 372.05,164.37 390.75,164.37 390.75,133.86 436.02,133.86 436.02,178.15 456.69,178.15

## 1445055-9 [mm]
pads (11):
  round 3 hole 3: 1(-9.85,0) 1(9.85,0)
  round 1.676 hole 1: 1(12,4.32) 2(9,4.32) 3(6,4.32) 4(3,4.32) 5(0,4.32) 6(-3,4.32) 7(-6,4.32) 8(-9,4.32) 9(-12,4.32)
Top Overlay:
  region: 0,0 0.254,0 0.254,0.254 0,0.254
  region: 0,0 0.254,0 0.254,0.254 0,0.254
  region: 0,0 0.254,0 0.254,0.254 0,0.254
  region: 0,0 0.254,0 0.254,0.254 0,0.254
  lines w0.203: -14.9,-0.7 -14.9,1.3 ; -14,-0.35 -14.525,-0.35 -14.525,-0.85 -14.75,-0.85 -15.475,-0.425 -15.475,1.025 -14.75,1.45 -14,1.45 ; -13.175,4.525 -13.9,4.525 -13.9,-4.5 13.9,-4.5 13.9,4.525 13.1,4.525 ; -10.925,4.175 -10.05,4.175 ; -7.925,4.175 -7.05,4.175 ; -4.925,4.175 -4.05,4.175 ; -1.925,4.175 -1.05,4.175 ; -1.8,-4.4 -1.8,-1.2 1.8,-1.2 1.8,-4.4 ; -1.425,-4.45 ccw(c-2.325,-3.775) -1.2,-3.775 -1.2,-2.65 ; 1.075,4.175 1.95,4.175 ; 1.425,-4.45 cw(c2.325,-3.775) 1.2,-3.775 1.2,-2.65 ; 4.075,4.175 4.95,4.175 ; 7.075,4.175 7.95,4.175 ; 10.075,4.175 10.95,4.175 ; 14,-1.45 14.75,-1.45 15.475,-1.025 15.475,0.425 14.75,0.85 14.525,0.85 14.525,0.35 14,0.35 ; 14.9,-1.3 14.9,0.7 ; -1.2,-2.65 1.2,-2.65 ; -1.2,-2.65 -1.2,-1.75 1.2,-1.75 1.2,-2.65
Mechanical 16:
  rectangle: 11.688,3.513 12.325,5
  rectangle: 5.688,3.513 6.325,5
  rectangle: 8.688,3.513 9.325,5
  rectangle: 2.688,3.513 3.325,5
  rectangle: -0.312,3.513 0.325,5
  rectangle: -3.312,3.513 -2.675,5
  rectangle: -6.312,3.513 -5.675,5
  rectangle: -9.312,3.513 -8.675,5
  rectangle: -12.312,3.513 -11.675,5
  lines w0.203: -13.175,4.525 -12.575,4.525 -12.575,3.4 -11.425,3.4 -11.425,4.175 -10.925,4.175 ; -10.05,4.175 -9.575,4.175 -9.575,3.4 -8.425,3.4 -8.425,4.175 -7.925,4.175 ; -7.05,4.175 -6.575,4.175 -6.575,3.4 -5.425,3.4 -5.425,4.175 -4.925,4.175 ; -4.05,4.175 -3.575,4.175 -3.575,3.4 -2.425,3.4 -2.425,4.175 -1.925,4.175 ; -1.05,4.175 -0.575,4.175 -0.575,3.4 0.575,3.4 0.575,4.175 1.075,4.175 ; 1.95,4.175 2.425,4.175 2.425,3.4 3.575,3.4 3.575,4.175 4.075,4.175 ; 4.95,4.175 5.425,4.175 5.425,3.4 6.575,3.4 6.575,4.175 7.075,4.175 ; 7.95,4.175 8.425,4.175 8.425,3.4 9.575,3.4 9.575,4.175 10.075,4.175 ; 10.95,4.175 11.425,4.175 11.425,3.4 12.575,3.4 12.575,4.525 13.1,4.525

## 1445055-10 [mil]
pads (12):
  round 118.11 hole 118.11: 1(-446.85,0) 1(446.85,0)
  round 66 hole 39.37: 1(531.5,170.08) 2(413.39,170.08) 3(295.28,170.08) 4(177.17,170.08) 5(59.06,170.08) 6(-59.06,170.08) 7(-177.17,170.08) 8(-295.28,170.08) 9(-413.39,170.08) 10(-531.5,170.08)
Top Overlay:
  region: 0,0 10,0 10,10 0,10
  region: 0,0 10,0 10,10 0,10
  region: 0,0 10,0 10,10 0,10
  region: 0,0 10,0 10,10 0,10
  lines w8: -645.67,-27.56 -645.67,51.18 ; -610.24,-13.78 -630.91,-13.78 -630.91,-33.46 -639.76,-33.46 -668.31,-16.73 -668.31,40.35 -639.76,57.09 -610.24,57.09 ; -577.76,178.15 -606.3,178.15 -606.3,-177.17 606.3,-177.17 606.3,178.15 574.8,178.15 ; -489.17,164.37 -454.72,164.37 ; -371.06,164.37 -336.61,164.37 ; -252.95,164.37 -218.5,164.37 ; -134.84,164.37 -100.39,164.37 ; -70.87,-173.23 -70.87,-47.24 70.87,-47.24 70.87,-173.23 ; -56.1,-175.2 ccw(c-91.54,-148.62) -47.24,-148.62 -47.24,-104.33 ; -16.73,164.37 17.72,164.37 ; 56.1,-175.2 cw(c91.54,-148.62) 47.24,-148.62 47.24,-104.33 ; 101.38,164.37 135.83,164.37 ; 219.49,164.37 253.94,164.37 ; 337.6,164.37 372.05,164.37 ; 455.71,164.37 490.16,164.37 ; 610.24,-57.09 639.76,-57.09 668.31,-40.35 668.31,16.73 639.76,33.46 630.91,33.46 630.91,13.78 610.24,13.78 ; 645.67,-51.18 645.67,27.56 ; -47.24,-104.33 47.24,-104.33 ; -47.24,-104.33 -47.24,-68.9 47.24,-68.9 47.24,-104.33
Mechanical 16:
  rectangle: 519.19,138.29 544.29,196.85
  rectangle: 282.97,138.29 308.07,196.85
  rectangle: 401.08,138.29 426.18,196.85
  rectangle: 164.86,138.29 189.96,196.85
  rectangle: 46.75,138.29 71.85,196.85
  rectangle: -71.36,138.29 -46.26,196.85
  rectangle: -189.47,138.29 -164.37,196.85
  rectangle: -307.58,138.29 -282.48,196.85
  rectangle: -425.69,138.29 -400.59,196.85
  rectangle: -543.8,138.29 -518.7,196.85
  lines w8: -577.76,178.15 -554.13,178.15 -554.13,133.86 -508.86,133.86 -508.86,164.37 -489.17,164.37 ; -454.72,164.37 -436.02,164.37 -436.02,133.86 -390.75,133.86 -390.75,164.37 -371.06,164.37 ; -336.61,164.37 -317.91,164.37 -317.91,133.86 -272.64,133.86 -272.64,164.37 -252.95,164.37 ; -218.5,164.37 -199.8,164.37 -199.8,133.86 -154.53,133.86 -154.53,164.37 -134.84,164.37 ; -100.39,164.37 -81.69,164.37 -81.69,133.86 -36.42,133.86 -36.42,164.37 -16.73,164.37 ; 17.72,164.37 36.42,164.37 36.42,133.86 81.69,133.86 81.69,164.37 101.38,164.37 ; 135.83,164.37 154.53,164.37 154.53,133.86 199.8,133.86 199.8,164.37 219.49,164.37 ; 253.94,164.37 272.64,164.37 272.64,133.86 317.91,133.86 317.91,164.37 337.6,164.37 ; 372.05,164.37 390.75,164.37 390.75,133.86 436.02,133.86 436.02,164.37 455.71,164.37 ; 490.16,164.37 508.86,164.37 508.86,133.86 554.13,133.86 554.13,178.15 574.8,178.15